# Altium footprint library RDM_ALT_PCB.PcbLib: 171 footprints (part 5 of 11)
Each footprint in its own frame and in the unit in brackets; x right, y up, seen from the top. Pads: shape width x height; smd on the part's side, far side on the other; paste and mask are expansions set on the pad; w line width, h text height; cw(c..) or ccw(c..) is an arc to the next point about the centre after c.
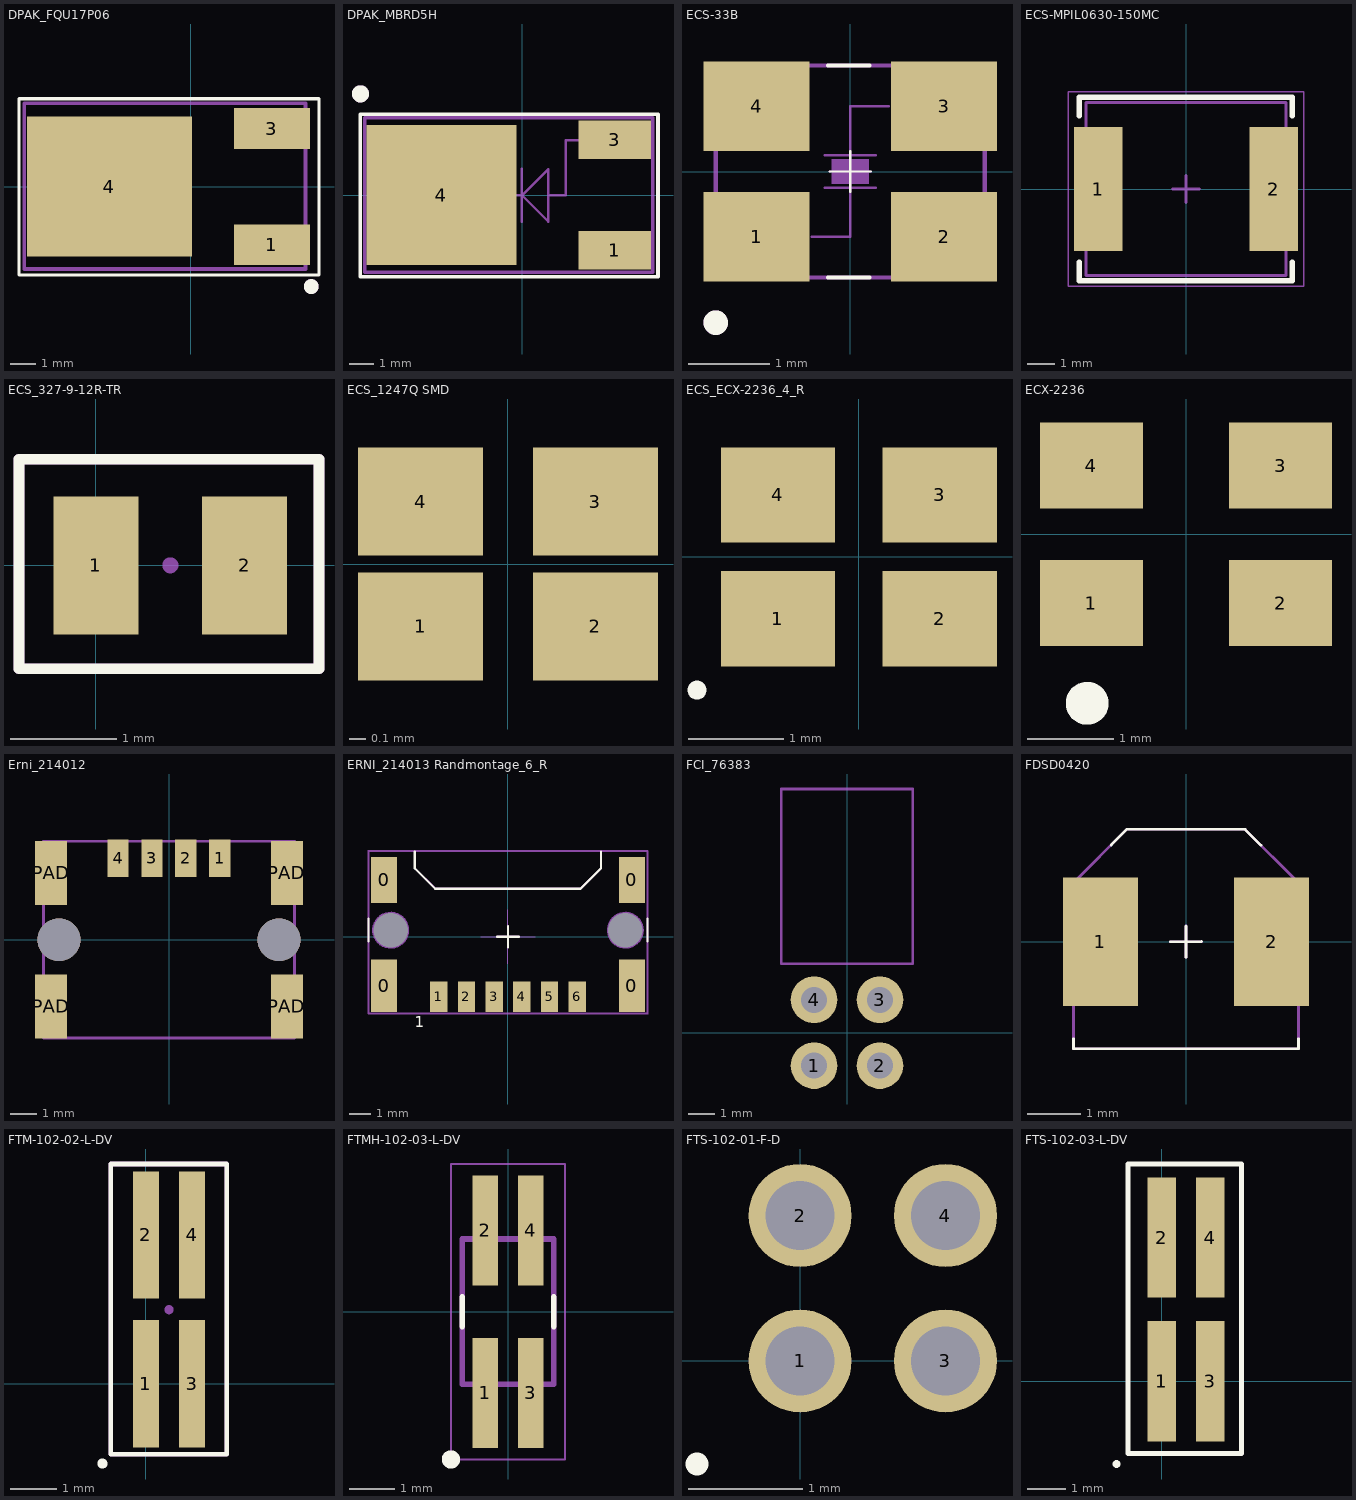
[diagram p4: the footprints below, top view; thin cyan lines are the x and y axes]

## DPAK_FQU17P06 [mm] "MOSFET P-CH 60V 12A DPAK"
pads (3):
  rect 3x1.6 smd: 1(3.2,-2.285) 3(3.2,2.285)
  rect 6.5x5.5 smd: 4(-3.2,0)
Top Overlay:
  circle w0.5: c4.75,-3.937 r0.04
  lines w0.127: -6.756,-3.48 -6.756,3.454 5.055,3.454 5.055,-3.48 -6.756,-3.48
Mechanical 13:
  circle w0.5: c4.75,-3.937 r0.04
Mechanical 15:
  circle w0.5: c4.75,-3.937 r0.04
  lines w0.15: -6.553,-3.251 4.521,-3.251 4.521,3.277 -6.553,3.277 -6.553,-3.251
  text "G" at 3.48,-2.642 h1
  text "S" at 3.48,1.93 h1
  text "D" at -2.896,-0.305 h1
3D body "FERD20H100SB-TR--3DModel-STEP-56544.STEP": height 2.6, standoff -0.03, extent -5.346,-3.27 4.529,3.27

## DPAK_MBRD5H [mm] "only pin 3 and 4 connected"
pads (3):
  rect 3x1.6 smd: 1(3.828,-2.285) 3(3.828,2.285)
  rect 6.2x5.8 smd: 4(-3.352,0)
Top Overlay:
  circle w0.508: c-6.706,4.191 r0.1
  lines w0.15: -6.706,-3.378 -6.706,3.353 5.613,3.353 5.613,-3.378 -6.706,-3.378
Mechanical 13:
  circle w0.508: c-6.706,4.191 r0.1
Mechanical 15:
  circle w0.254: c-2.952,0 r0.025
  circle w0.254: c3.573,2.275 r0.025
  circle w0.508: c-6.706,4.191 r0.1
  lines w0.1: -2.952,0 -0.027,0 1.073,-1.1 1.073,1.075 -0.002,0 ; -0.027,-1.1 -0.027,1.1 ; 1.098,0 1.798,0 1.798,2.275 3.573,2.275
  lines w0.15: -6.527,-3.2 -6.527,3.2 5.398,3.2 5.398,-3.2 -6.527,-3.2
3D body "FERD20H100SB-TR--3DModel-STEP-56544.STEP": height 2.6, standoff -0.03, extent -5.373,-3.27 4.502,3.27

## ECS-33B [mm] "SMD Crystal, SMD; Body 3.2 x 2.5 mm (LxW max)"
height 0.8
pads (4):
  rect 1.3x1.1 smd: 1(-1.15,-0.8) 2(1.15,-0.8) 3(1.15,0.8) 4(-1.15,0.8)
Top Overlay:
  circle w0.25: c-1.65,-1.854 r0.025
  lines w0.03: -0.25,0 0.25,0 ; 0,-0.25 0,0.25
  lines w0.05: -0.272,-1.3 0.236,-1.3 ; -0.272,1.3 0.236,1.3
Mechanical 13:
  circle w0.25: c-1.651,-1.854 r0.025
  region: -0.225,0.15 0.225,0.15 0.225,-0.15 -0.225,-0.15
  lines w0.03: -0.475,-0.8 0,-0.8 0,-0.263 ; -0.313,-0.2 0.312,-0.2 ; -0.313,0.2 0.312,0.2 ; -0.25,0 0.25,0 ; 0,-0.25 0,0.25 ; 0,0.263 0,0.8 0.475,0.8
  lines w0.05: -1.65,-1.3 -1.65,1.3 1.65,1.3 1.65,-1.3 -1.65,-1.3
Mechanical 15:
  circle w0.25: c-1.651,-1.854 r0.025
  region: -0.225,0.15 0.225,0.15 0.225,-0.15 -0.225,-0.15
  lines w0.03: -0.475,-0.8 0,-0.8 0,-0.263 ; -0.313,-0.2 0.312,-0.2 ; -0.313,0.2 0.312,0.2 ; -0.25,0 0.25,0 ; 0,-0.25 0,0.25 ; 0,0.263 0,0.8 0.475,0.8
  lines w0.05: -1.65,-1.3 1.65,-1.3 1.65,1.3 -1.65,1.3 -1.65,-1.3
Multi-Layer:
  pour cut-out: -1.88,1.37
3D body "ECS-120-18-33-JGN-TR--3DModel-STEP-40055.STEP": height 0.81, standoff 0.01, extent -1.6,-1.25 1.6,1.25

## ECS-MPIL0630-150MC [mm] "Fixed Inductors 15uH +/-20% 5A Iron Core Shielded"
height 3
pads (2):
  rect 1.8x4.6 smd: 1(-3.25,0) 2(3.25,0)
Top Overlay:
  lines w0.2: -3.95,-2.7 -3.95,-3.4 3.925,-3.4 3.925,-2.7 ; -3.95,2.7 -3.95,3.4 3.925,3.4 3.925,2.7
Mechanical 13:
  lines w0.1: -3.7,-3.2 -3.7,3.2 3.7,3.2 3.7,-3.2 -3.7,-3.2
Mechanical 15:
  lines w0.05: -4.35,-3.6 -4.35,3.6 4.35,3.6 4.35,-3.6 -4.35,-3.6
  lines w0.1: -0.5,0 0.5,0 ; 0,-0.5 0,0.5
3D body: height 0.25, standoff 0, extent -0.1,1.35 -0.1,1.35
3D body: height 0.25, standoff 0, extent 0,0 0,0
3D body: height 3, standoff 0.1, extent -3.7,-3.2 3.7,3.2

## ECS_327-9-12R-TR [mm] "SMD CRYSTAL 32.7680KHZ"
height 0.6
pads (2):
  rect 0.8x1.3 smd: 1(0,0) 2(1.4,0)
Top Overlay:
  lines w0.1: -0.725,-0.975 2.1,-0.975 2.1,1 -0.725,1 -0.725,-0.975
Mechanical 15:
  circle w0.1: c0.7,0 r0.025
  lines w0.1: -0.725,0.975 -0.7,1 2.1,1 2.1,-0.975 -0.725,-0.975 -0.725,1
3D body "ECS-.327-12.5-12QS-TR--3DModel-STEP-40055.STEP": height 0.61, standoff 0.01, extent -0.3,-0.6 1.7,0.6

## ECS_1247Q SMD [mm] "1.6*1.3mm Footprint"
pads (4):
  rect 0.75x0.65 smd: 1(-0.525,-0.375) 2(0.525,-0.375) 3(0.525,0.375) 4(-0.525,0.375)

## ECS_ECX-2236_4_R [mm] "ECS_ECX-2236_4_R"
height 0.5
pads (4):
  rect 1.2x1 smd: 1(-0.85,-0.65) 2(0.85,-0.65) 3(0.85,0.65) 4(-0.85,0.65)
Top Overlay:
  circle w0.2: c-1.7,-1.4 r0
3D body: height 0.5, standoff 0, extent -1.25,-1 1.25,1

## ECX-2236 [mm] "Quartz Crystal, SM; Body 3.4 x 2.7 mm (LxW max)"
height 0.5
pads (4):
  rect 1.2x1 smd: 1(-1.1,-0.8) 2(1.1,-0.8) 3(1.1,0.8) 4(-1.1,0.8)
Top Overlay:
  circle w0.25: c-1.15,-1.967 r0.125

## Erni_214012 [mm] "Stecker"
height 3
pads (8):
  rect 0.8x1.4 smd: 1(1.905,3.05) 2(0.633,3.05) 3(-0.637,3.05) 4(-1.907,3.05)
  rect 1.2x2.4 smd: PAD(-4.415,-2.5) PAD(-4.415,2.5) PAD(4.415,-2.5) PAD(4.415,2.5)
via 4.115,0 diameter 1.6 hole 1.6
via -4.115,0 diameter 1.6 hole 1.6
Mechanical 15:
  lines w0.1: -4.699,-3.683 4.699,-3.683 4.699,3.683 -4.699,3.683 -4.699,-3.683

## ERNI_214013 Randmontage_6_R [mm] "ERNI_214013 Randmontage_6_R"
height 2.98
pads (12):
  rect 1.2x2.4 smd: 0(-5.685,-2.25) 0(5.685,-2.25)
  rect 1.2x2.12 smd: 0(-5.685,2.61) 0(5.685,2.61)
  round 0 hole 1.6 unplated paste+0 mask+0.102: 0(-5.385,0.3)
  round 0 hole 1.6 unplated: 0(5.385,0.3)
  rect 0.8x1.4 smd: 1(-3.175,-2.75) 2(-1.905,-2.75) 3(-0.635,-2.75) 4(0.635,-2.75) 5(1.905,-2.75) 6(3.175,-2.75)
Top Overlay:
  lines w0.1: -6.4,-0.225 -6.4,0.825 ; -4.281,3.906 -4.281,3.145 -3.336,2.2 3.327,2.2 4.271,3.145 4.271,3.906 ; -0.5,0 0,0 ; 0,-0.5 0,0 ; 0,0.5 0,0 ; 0.5,0 0,0 ; 6.405,-0.225 6.405,0.825
  text "1" at -4.281,-4.147 h0.5
Mechanical 13:
  circle w0.1: c5.386,0.3 r0.8
  circle w0.1: c-5.384,0.3 r0.8
  lines w0.01: -1.25,0 1.25,0 ; 0,-1.25 0,1.25
  lines w0.1: -6.399,-3.521 6.402,-3.521 6.405,-3.518 6.405,3.936 ; -6.399,-3.516 -6.399,3.938 -6.396,3.941 6.405,3.941 ; -4.276,3.906 -4.276,3.145 -3.332,2.2 3.332,2.2 4.276,3.145 4.276,3.906
Mechanical 15:
  circle w0.1: c-5.385,0.3 r0.8
  circle w0.1: c5.385,0.3 r0.8
  lines w0.1: -6.4,-3.521 6.402,-3.521 6.404,-3.519 6.404,3.936 ; -6.4,-3.516 -6.4,3.913 ; -6.397,3.941 6.404,3.941 ; -4.276,3.906 -4.276,3.145 -3.332,2.2 3.332,2.2 4.276,3.145 4.276,3.906 ; -0.5,0 0,0 ; 0,-0.5 0,0 ; 0,0.5 0,0 ; 0.5,0 0,0
  text "1" at -4.278,-4.148 h0.5
3D body "214013.STEP": height 2.96, standoff -0.77, extent -6.345,-3.31 6.355,3.89

## FCI_76383 [mm]
height 7.8
pads (4):
  round 1.8 hole 1: 1(-1.27,-1.27) 2(1.27,-1.27) 3(1.27,1.27) 4(-1.27,1.27)
Mechanical 15:
  lines w0.1: -2.54,2.667 2.54,2.667 2.54,9.398 -2.54,9.398 -2.54,2.667

## FDSD0420 [mm] "FIXED IND 10UH 1.7A 200 MOHM SMD"
pads (2):
  rect 1.4x2.4 smd: 1(-1.6,0) 2(1.6,0)
Top Overlay:
  lines w0.05: -2.1,-1.81 -2.1,-2 2.1,-2 2.1,-1.81 ; -1.397,1.803 -1.1,2.1 1.1,2.1 ; -0.291,0 0.29,0.003 ; -0.002,0.292 0.001,-0.289 ; 1.105,2.095 1.402,1.798
Mechanical 13:
  lines w0.05: -0.291,0 0.29,0.003 ; -0.002,0.292 0.001,-0.289 ; 1.1,2.1 -1.1,2.1 -2.1,1.1 -2.1,-2 2.1,-2 2.1,1.1 1.105,2.095
Mechanical 15:
  lines w0.05: -0.29,-0.001 0.291,0.002 ; -0.001,0.291 0.002,-0.29 ; 1.1,2.1 -1.1,2.1 -2.1,1.1 -2.1,-2 2.1,-2 2.1,1.1 1.105,2.095
3D body: height 2, standoff 0, extent -2.1,-2 2.1,2.1

## FTM-102-02-L-DV [mm] "CONN HEADER SMD 4POS 1.00MM"
pads (4):
  rect 0.56x2.755 smd: 1(0,0) 2(0,3.215) 3(1,0) 4(1,3.215)
Top Overlay:
  circle w0.2: c-0.94,-1.727 r0.01
  lines w0.1: -0.762,-1.524 -0.762,4.75 1.75,4.75 1.75,-1.524 -0.754,-1.524
Mechanical 15:
  circle w0.1: c0.5,1.6 r0.05
  lines w0.1: -0.762,-1.524 1.75,-1.524 1.75,4.75 -0.762,4.75 -0.762,-1.524
3D body "FTM-102-02-L-DV.stp": height 3.13, standoff -0.04, extent -0.5,-0.964 1.5,4.243

## FTMH-102-03-L-DV [mm] "CONN HEADER SMD 4POS 1MM"
pads (4):
  rect 0.56x2.41 smd: 1(-0.5,-1.78) 2(-0.5,1.78) 3(0.5,-1.78) 4(0.5,1.78)
Top Overlay:
  circle w0.2: c-1.25,-3.235 r0.1
  lines w0.127: -1,-0.325 -1,0.325 ; 1,-0.325 1,0.325
Mechanical 4:
  circle w0.2: c-0.5,-1.2 r0.1
  circle w0.2: c-0.5,-1.2 r0.1
  lines w0.127: -1,-1.59 1,-1.59 ; -1,-1.59 -1,1.59 ; -1,-1.59 1,-1.59 ; -1,-1.59 -1,1.59 ; -1,1.59 1,1.59 ; -1,1.59 1,1.59 ; 1,-1.59 1,1.59 ; 1,-1.59 1,1.59
Mechanical 16:
  lines w0.05: -1.25,-3.235 -1.25,3.235 1.25,3.235 1.25,-3.235 -1.25,-3.235

## FTS-102-01-F-D [mm] "CONN HEADER SMD 4POS 1.27 MM THROUGH HOLE"
pads (4):
  round 0.9 hole 0.6: 1(0,0) 2(0,1.27) 3(1.27,0) 4(1.27,1.27)
Top Overlay:
  circle w0.2: c-0.9,-0.9 r0
3D body "CON4_2x2_TU_FTS.step": height 6.46, standoff -2.53, extent -0.635,-0.635 1.905,1.905

## FTS-102-03-L-DV [mm] "CONN HEADER SMD 4POS 1.27MM"
pads (4):
  rect 0.74x3.125 smd: 1(0,0) 2(0,3.735) 3(1.27,0) 4(1.27,3.735)
Top Overlay:
  circle w0.2: c-1.17,-2.15 r0
  lines w0.127: -0.875,-1.875 2.075,-1.875 2.075,5.65 -0.875,5.65 -0.875,-1.875
Mechanical 15:
  lines w0.1: -0.875,-1.875 2.075,-1.875 2.075,5.65 -0.875,5.65 -0.875,-1.875
3D body "stiftleiste_a-sl127-dg-g04mp1.stp": height 6.41, standoff 0.01, extent -0.645,-0.877 1.895,4.627